# Altium schematic symbol library 13-Analog D 数模模数.SchLib: 573 symbols (part 3 of 6)
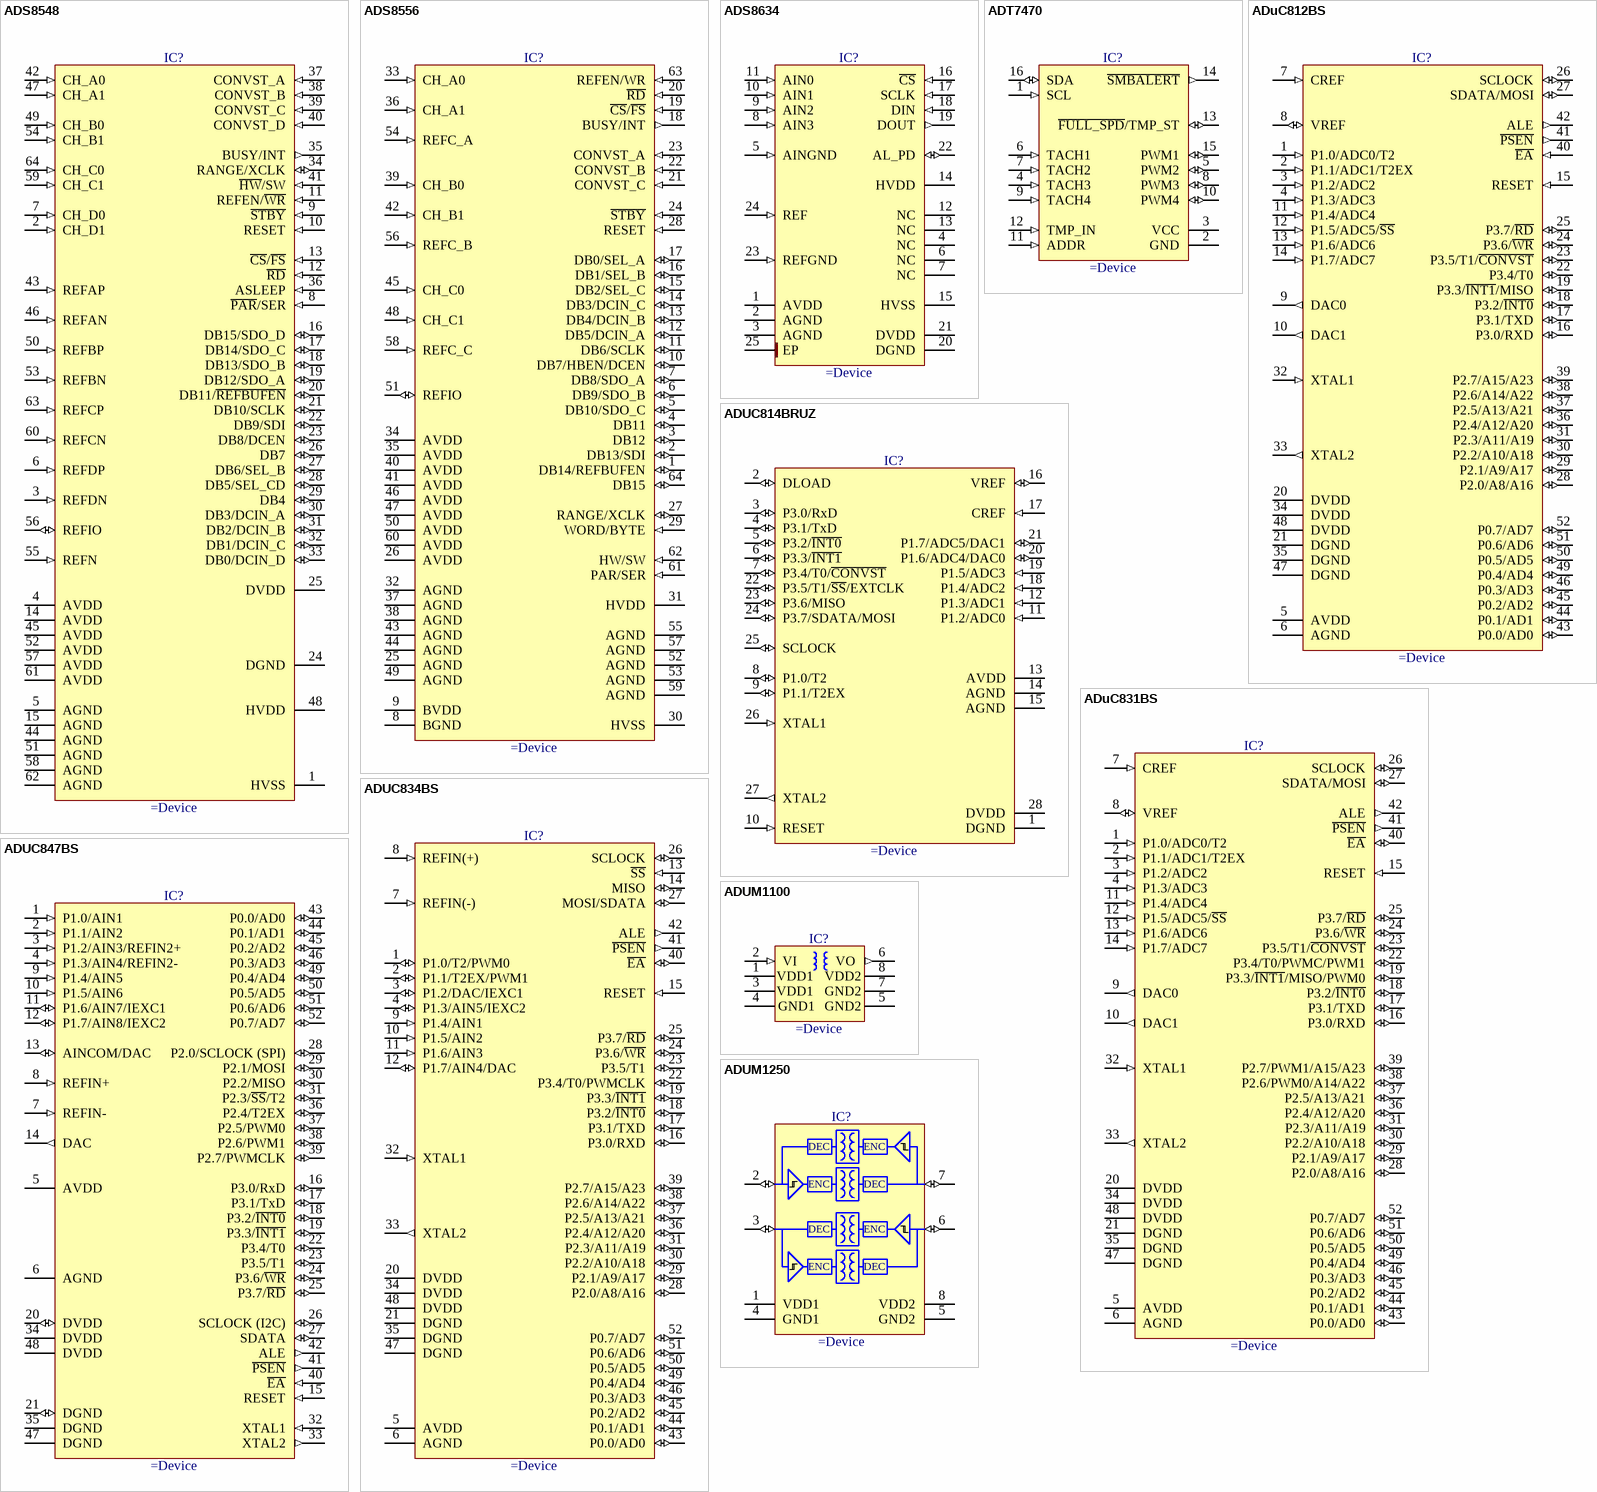
[diagram p42: symbols ADS8548 to ADUM1250]

## ADS8548
designator IC?
14-Bit, 600kSPS (PAR) or 450kSPS (SER), Eight-Channel, Simultaneous Sampling ADC
pins: 1 HVSS (power), 2 CH_D1 (in), 3 REFDN (in), 4 AVDD (power), 5 AGND (power), 6 REFDP (in), 7 CH_D0 (in), 8 ~{PAR}/SER (in), 9 ~{STBY} (in), 10 RESET (in), 11 REFEN/~{WR} (in), 12 ~{RD} (in), 13 ~{CS}/~{FS} (in), 14 AVDD (power), 15 AGND (power), 16 DB15/SDO_D (io), 17 DB14/SDO_C (io), 18 DB13/SDO_B (io), 19 DB12/SDO_A (io), 20 DB11/~{REFBUFEN} (io), 21 DB10/SCLK (io), 22 DB9/SDI (io), 23 DB8/DCEN (io), 24 DGND (power), 25 DVDD (power), 26 DB7 (io), 27 DB6/SEL_B (io), 28 DB5/SEL_CD (io), 29 DB4 (io), 30 DB3/DCIN_A (io), 31 DB2/DCIN_B (io), 32 DB1/DCIN_C (io), 33 DB0/DCIN_D (io), 34 RANGE/XCLK (io), 35 BUSY/INT (out), 36 ASLEEP (in), 37 CONVST_A (in), 38 CONVST_B (in), 39 CONVST_C (in), 40 CONVST_D (in), 41 ~{HW}/SW (in), 42 CH_A0 (in), 43 REFAP (in), 44 AGND (power), 45 AVDD (power), 46 REFAN (in), 47 CH_A1 (in), 48 HVDD (power), 49 CH_B0 (in), 50 REFBP (in), 51 AGND (power), 52 AVDD (power), 53 REFBN (in), 54 CH_B1 (in), 55 REFN (in), 56 REFIO (io), 57 AVDD (power), 58 AGND (power), 59 CH_C1 (in), 60 REFCN (in), 61 AVDD (power), 62 AGND (power), 63 REFCP (in), 64 CH_C0 (in)

## ADS8556
designator IC?
16-Bit, 630kSPS (PAR) or 450kSPS (SER), Six-Channel, Simultaneous Sampling ADC
pins: 1 DB14/REFBUFEN (io), 2 DB13/SDI (io), 3 DB12 (io), 4 DB11 (io), 5 DB10/SDO_C (io), 6 DB9/SDO_B (io), 7 DB8/SDO_A (io), 8 BGND (power), 9 BVDD (power), 10 DB7/HBEN/DCEN (io), 11 DB6/SCLK (io), 12 DB5/DCIN_A (io), 13 DB4/DCIN_B (io), 14 DB3/DCIN_C (io), 15 DB2/SEL_C (io), 16 DB1/SEL_B (io), 17 DB0/SEL_A (io), 18 BUSY/INT (out), 19 ~{CS}/~{FS} (in), 20 ~{RD} (in), 21 CONVST_C (in), 22 CONVST_B (in), 23 CONVST_A (in), 24 ~{STBY} (in), 25 AGND (power), 26 AVDD (power), 27 RANGE/XCLK (io), 28 RESET (in), 29 WORD/BYTE (in), 30 HVSS (power), 31 HVDD (power), 32 AGND (power), 33 CH_A0 (in), 34 AVDD (power), 35 AVDD (power), 36 CH_A1 (in), 37 AGND (power), 38 AGND (power), 39 CH_B0 (in), 40 AVDD (power), 41 AVDD (power), 42 CH_B1 (in), 43 AGND (power), 44 AGND (power), 45 CH_C0 (in), 46 AVDD (power), 47 AVDD (power), 48 CH_C1 (in), 49 AGND (power), 50 AVDD (power), 51 REFIO (io), 52 AGND (power), 53 AGND (power), 54 REFC_A (in), 55 AGND (power), 56 REFC_B (in), 57 AGND (power), 58 REFC_C (in), 59 AGND (power), 60 AVDD (power), 61 PAR/SER (in), 62 HW/SW (in), 63 REFEN/WR (in), 64 DB15 (io)

## ADS8634
designator IC?
12-Bit, 1MSPS, 4-Channel, Bipolar-Input, SAR Analog-to-Digital Converter with Software-Selectable Ranges
pins: 1 AVDD (power), 2 AGND (power), 3 AGND (power), 4 NC, 5 AINGND (in), 6 NC, 7 NC, 8 AIN3 (in), 9 AIN2 (in), 10 AIN1 (in), 11 AIN0 (in), 12 NC, 13 NC, 14 HVDD (power), 15 HVSS (power), 16 ~{CS} (in), 17 SCLK (in), 18 DIN (in), 19 DOUT (out), 20 DGND (power), 21 DVDD (power), 22 AL_PD (io), 23 REFGND (in), 24 REF (in), 25 EP (power)

## ADT7470
designator IC?
Temperature Sensor Hub and Fan Controller
pins: 1 SCL (in), 2 GND (power), 3 VCC (power), 4 TACH3 (in), 5 PWM2 (io), 6 TACH1 (in), 7 TACH2 (in), 8 PWM3 (io), 9 TACH4 (in), 10 PWM4 (io), 11 ADDR (in), 12 TMP_IN (in), 13 ~{FULL_SPD}/TMP_ST (io), 14 ~{SMBALERT} (out), 15 PWM1 (io), 16 SDA (io)

## ADuC812BS
designator IC?
MicroConverter®, Multichannel 12-Bit ADC With Embedded Flash MCU
pins: 1 P1.0/ADC0/T2 (in), 2 P1.1/ADC1/T2EX (in), 3 P1.2/ADC2 (in), 4 P1.3/ADC3 (in), 5 AVDD (power), 6 AGND (power), 7 CREF (in), 8 VREF (io), 9 DAC0 (out), 10 DAC1 (out), 11 P1.4/ADC4 (in), 12 P1.5/ADC5/~{SS} (in), 13 P1.6/ADC6 (in), 14 P1.7/ADC7 (in), 15 RESET (in), 16 P3.0/RXD (io), 17 P3.1/TXD (io), 18 P3.2/~{INT0} (io), 19 P3.3/~{INT1}/MISO (io), 20 DVDD (power), 21 DGND (power), 22 P3.4/T0 (io), 23 P3.5/T1/~{CONVST} (io), 24 P3.6/~{WR} (io), 25 P3.7/~{RD} (io), 26 SCLOCK (io), 27 SDATA/MOSI (io), 28 P2.0/A8/A16 (io), 29 P2.1/A9/A17 (io), 30 P2.2/A10/A18 (io), 31 P2.3/A11/A19 (io), 32 XTAL1 (in), 33 XTAL2 (out), 34 DVDD (power), 35 DGND (power), 36 P2.4/A12/A20 (io), 37 P2.5/A13/A21 (io), 38 P2.6/A14/A22 (io), 39 P2.7/A15/A23 (io), 40 ~{EA} (in), 41 ~{PSEN} (out), 42 ALE (out), 43 P0.0/AD0 (io), 44 P0.1/AD1 (io), 45 P0.2/AD2 (io), 46 P0.3/AD3 (io), 47 DGND (power), 48 DVDD (power), 49 P0.4/AD4 (io), 50 P0.5/AD5 (io), 51 P0.6/AD6 (io), 52 P0.7/AD7 (io)

## ADUC814BRUZ
designator IC?
MicroConverter®, Small Package 12-Bit ADC with Embedded Flash MCU
pins: 1 DGND (power), 2 DLOAD (io), 3 P3.0/RxD (io), 4 P3.1/TxD (io), 5 P3.2/~{INT0} (io), 6 P3.3/~{INT1} (io), 7 P3.4/T0/~{CONVST} (io), 8 P1.0/T2 (io), 9 P1.1/T2EX (io), 10 RESET (in), 11 P1.2/ADC0 (in), 12 P1.3/ADC1 (in), 13 AVDD (power), 14 AGND (power), 15 AGND (power), 16 VREF (io), 17 CREF (in), 18 P1.4/ADC2 (in), 19 P1.5/ADC3 (in), 20 P1.6/ADC4/DAC0 (io), 21 P1.7/ADC5/DAC1 (io), 22 P3.5/T1/~{SS}/EXTCLK (io), 23 P3.6/MISO (io), 24 P3.7/SDATA/MOSI (io), 25 SCLOCK (io), 26 XTAL1 (in), 27 XTAL2 (out), 28 DVDD (power)

## ADuC831BS
designator IC?
MicroConverter®, 12-Bit ADCs And DACs With Embedded 62 kBytes Flash MCU
pins: 1 P1.0/ADC0/T2 (in), 2 P1.1/ADC1/T2EX (in), 3 P1.2/ADC2 (in), 4 P1.3/ADC3 (in), 5 AVDD (power), 6 AGND (power), 7 CREF (in), 8 VREF (io), 9 DAC0 (out), 10 DAC1 (out), 11 P1.4/ADC4 (in), 12 P1.5/ADC5/~{SS} (in), 13 P1.6/ADC6 (in), 14 P1.7/ADC7 (in), 15 RESET (in), 16 P3.0/RXD (io), 17 P3.1/TXD (io), 18 P3.2/~{INT0} (io), 19 P3.3/~{INT1}/MISO/PWM0 (io), 20 DVDD (power), 21 DGND (power), 22 P3.4/T0/PWMC/PWM1 (io), 23 P3.5/T1/~{CONVST} (io), 24 P3.6/~{WR} (io), 25 P3.7/~{RD} (io), 26 SCLOCK (io), 27 SDATA/MOSI (io), 28 P2.0/A8/A16 (io), 29 P2.1/A9/A17 (io), 30 P2.2/A10/A18 (io), 31 P2.3/A11/A19 (io), 32 XTAL1 (in), 33 XTAL2 (out), 34 DVDD (power), 35 DGND (power), 36 P2.4/A12/A20 (io), 37 P2.5/A13/A21 (io), 38 P2.6/PWM0/A14/A22 (io), 39 P2.7/PWM1/A15/A23 (io), 40 ~{EA} (io), 41 ~{PSEN} (out), 42 ALE (out), 43 P0.0/AD0 (io), 44 P0.1/AD1 (io), 45 P0.2/AD2 (io), 46 P0.3/AD3 (io), 47 DGND (power), 48 DVDD (power), 49 P0.4/AD4 (io), 50 P0.5/AD5 (io), 51 P0.6/AD6 (io), 52 P0.7/AD7 (io)

## ADUC834BS
designator IC?
MicroConverter®, Dual 16-Bit/24-Bit Delta-Sigma ADC ADCs With Embedded 62 kB Flash MCU
pins: 1 P1.0/T2/PWM0 (io), 2 P1.1/T2EX/PWM1 (io), 3 P1.2/DAC/IEXC1 (io), 4 P1.3/AIN5/IEXC2 (io), 5 AVDD (power), 6 AGND (power), 7 REFIN(-) (in), 8 REFIN(+) (in), 9 P1.4/AIN1 (in), 10 P1.5/AIN2 (in), 11 P1.6/AIN3 (in), 12 P1.7/AIN4/DAC (io), 13 ~{SS} (in), 14 MISO (io), 15 RESET (in), 16 P3.0/RXD (io), 17 P3.1/TXD (io), 18 P3.2/~{INT0} (io), 19 P3.3/~{INT1} (io), 20 DVDD (power), 21 DGND (power), 22 P3.4/T0/PWMCLK (io), 23 P3.5/T1 (io), 24 P3.6/~{WR} (io), 25 P3.7/~{RD} (io), 26 SCLOCK (io), 27 MOSI/SDATA (io), 28 P2.0/A8/A16 (io), 29 P2.1/A9/A17 (io), 30 P2.2/A10/A18 (io), 31 P2.3/A11/A19 (io), 32 XTAL1 (in), 33 XTAL2 (out), 34 DVDD (power), 35 DGND (power), 36 P2.4/A12/A20 (io), 37 P2.5/A13/A21 (io), 38 P2.6/A14/A22 (io), 39 P2.7/A15/A23 (io), 40 ~{EA} (io), 41 ~{PSEN} (out), 42 ALE (out), 43 P0.0/AD0 (io), 44 P0.1/AD1 (io), 45 P0.2/AD2 (io), 46 P0.3/AD3 (io), 47 DGND (power), 48 DVDD (power), 49 P0.4/AD4 (io), 50 P0.5/AD5 (io), 51 P0.6/AD6 (io), 52 P0.7/AD7 (io)

## ADUC847BS
designator IC?
MicroConverter® Multichannel 24-Bit ADCs with Embedded 62 kB Flash and Single-Cycle MCU
pins: 1 P1.0/AIN1 (in), 2 P1.1/AIN2 (in), 3 P1.2/AIN3/REFIN2+ (in), 4 P1.3/AIN4/REFIN2- (in), 5 AVDD (power), 6 AGND (power), 7 REFIN- (in), 8 REFIN+ (in), 9 P1.4/AIN5 (in), 10 P1.5/AIN6 (in), 11 P1.6/AIN7/IEXC1 (io), 12 P1.7/AIN8/IEXC2 (io), 13 AINCOM/DAC (io), 14 DAC (out), 15 RESET (in), 16 P3.0/RxD (io), 17 P3.1/TxD (io), 18 P3.2/~{INT0} (io), 19 P3.3/~{INT1} (io), 20 DVDD (io), 21 DGND (io), 22 P3.4/T0 (io), 23 P3.5/T1 (io), 24 P3.6/~{WR} (io), 25 P3.7/~{RD} (io), 26 SCLOCK (I2C) (io), 27 SDATA (io), 28 P2.0/SCLOCK (SPI) (io), 29 P2.1/MOSI (io), 30 P2.2/MISO (io), 31 P2.3/~{SS}/T2 (io), 32 XTAL1 (in), 33 XTAL2 (out), 34 DVDD (power), 35 DGND (power), 36 P2.4/T2EX (io), 37 P2.5/PWM0 (io), 38 P2.6/PWM1 (io), 39 P2.7/PWMCLK (io), 40 ~{EA} (in), 41 ~{PSEN} (out), 42 ALE (out), 43 P0.0/AD0 (io), 44 P0.1/AD1 (io), 45 P0.2/AD2 (io), 46 P0.3/AD3 (io), 47 DGND (power), 48 DVDD (power), 49 P0.4/AD4 (io), 50 P0.5/AD5 (io), 51 P0.6/AD6 (io), 52 P0.7/AD7 (io)

## ADUM1100
designator IC?
iCoupler® Digital Isolator
pins: 1 VDD1 (power), 2 VI (in), 3 VDD1 (power), 4 GND1 (power), 5 GND2 (power), 6 VO (out), 7 GND2 (power), 8 VDD2 (power)

## ADUM1250
designator IC?
Hot Swappable, Dual I2C Isolator
pins: 1 VDD1 (power), 2 SDA1 (io), 3 SCL1 (io), 4 GND1 (power), 5 GND2 (power), 6 SCL2 (io), 7 SDA2 (io), 8 VDD2 (power)
text: DEC; ENC

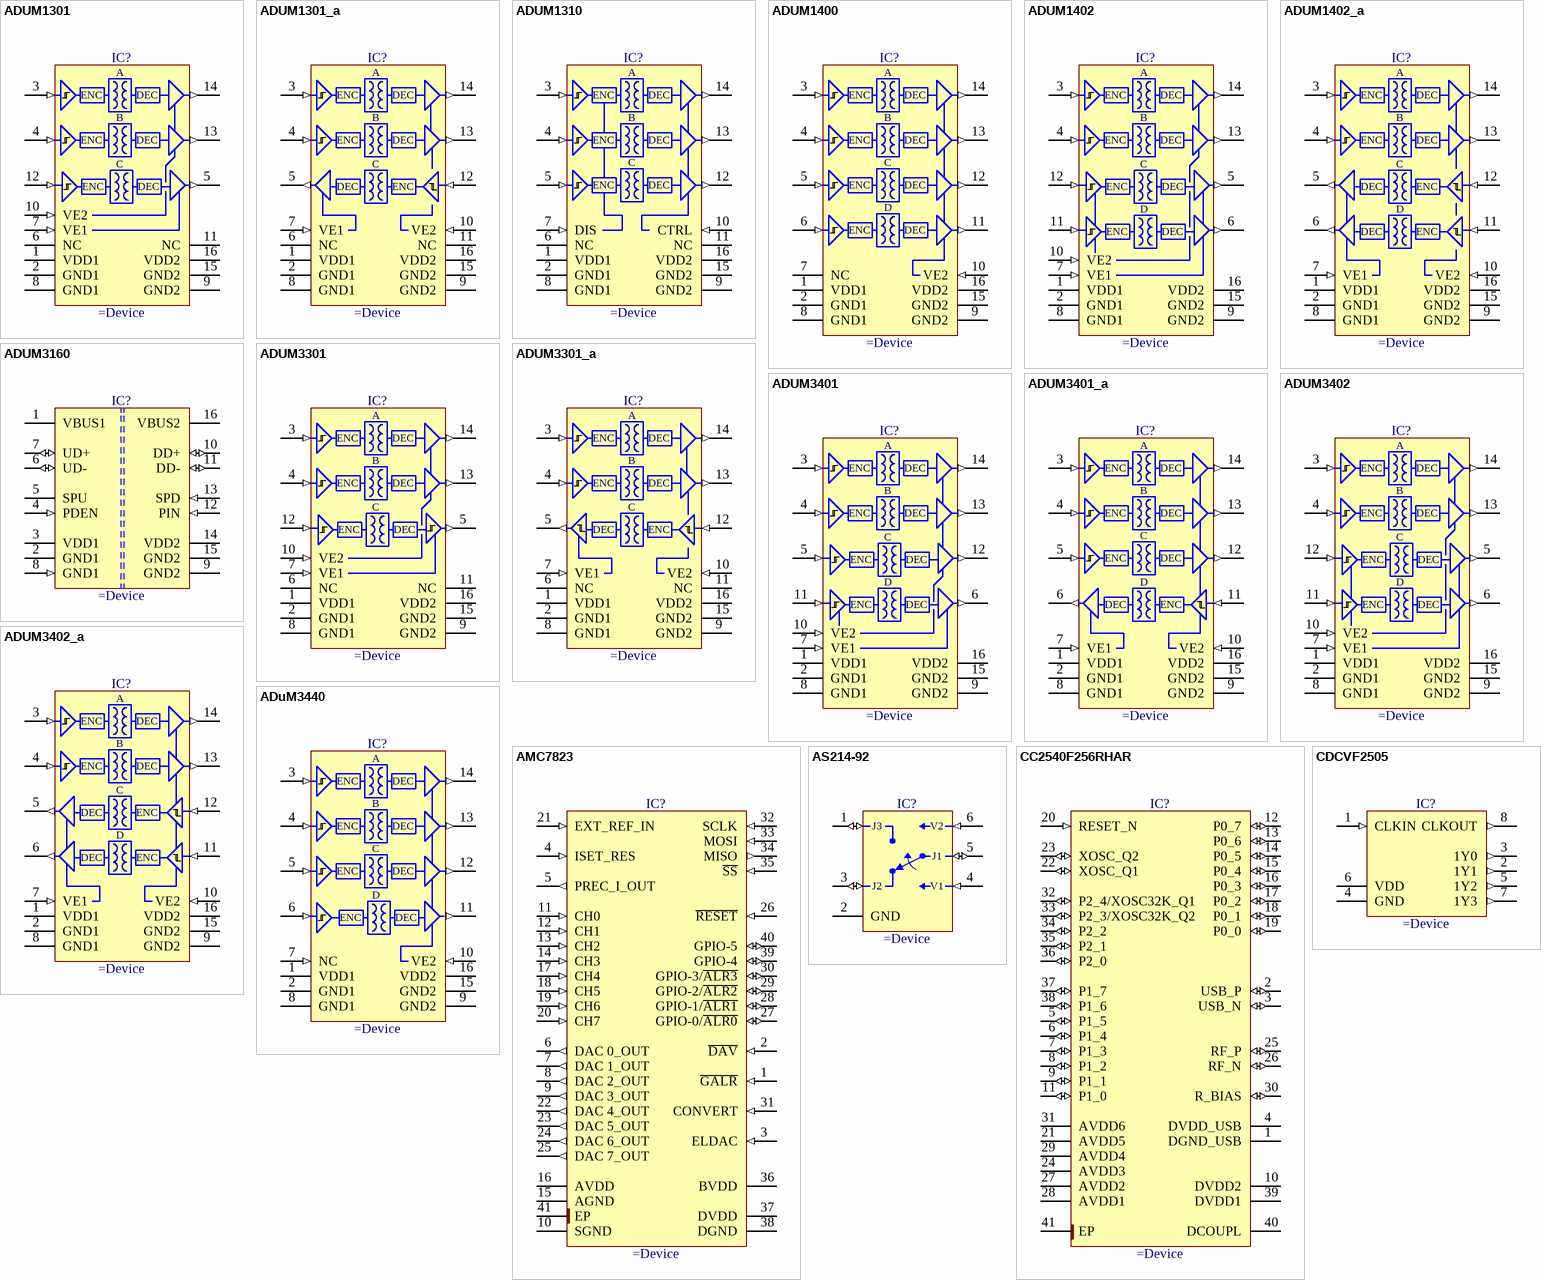
[diagram p15: symbols ADUM1301 to CDCVF2505]

## ADUM1301
designator IC?
Triple-Channel Digital Isolators
pins: 1 VDD1 (power), 2 GND1 (power), 3 VIA (in), 4 VIB (in), 5 VOC (out), 6 NC, 7 VE1 (in), 8 GND1 (power), 9 GND2 (power), 10 VE2 (in), 11 NC, 12 VIC (in), 13 VOB (out), 14 VOA (out), 15 GND2 (power), 16 VDD2 (power)
text: A; ENC; DEC; B; C

## ADUM1301_a
designator IC?
Triple-Channel Digital Isolators
pins: 1 VDD1 (power), 2 GND1 (power), 3 VIA (in), 4 VIB (in), 5 VOC (out), 6 NC, 7 VE1 (in), 8 GND1 (power), 9 GND2 (power), 10 VE2 (in), 11 NC, 12 VIC (in), 13 VOB (out), 14 VOA (out), 15 GND2 (power), 16 VDD2 (power)
text: A; ENC; DEC; B; C

## ADUM1310
designator IC?
Triple-Channel Digital Isolator
pins: 1 VDD1 (power), 2 GND1 (power), 3 VIA (in), 4 VIB (in), 5 VIC (in), 6 NC, 7 DIS (in), 8 GND1 (power), 9 GND2 (power), 10 CTRL (in), 11 NC, 12 VOC (out), 13 VOB (out), 14 VOA (out), 15 GND2 (power), 16 VDD2 (power)
text: A; ENC; DEC; B; C

## ADUM1400
designator IC?
Quad-Channel Digital Isolator
pins: 1 VDD1 (power), 2 GND1 (power), 3 VIA (in), 4 VIB (in), 5 VIC (in), 6 VID (in), 7 NC, 8 GND1 (power), 9 GND2 (power), 10 VE2 (in), 11 VOD (out), 12 VOC (out), 13 VOB (out), 14 VOA (out), 15 GND2 (power), 16 VDD2 (power)
text: A; ENC; DEC; B; C; D

## ADUM1402
designator IC?
Quad-Channel Digital Isolator (2/2 Channel Directionality)
pins: 1 VDD1 (power), 2 GND1 (power), 3 VIA (in), 4 VIB (in), 5 VOC (out), 6 VOD (out), 7 VE1 (in), 8 GND1 (power), 9 GND2 (power), 10 VE2 (in), 11 VID (in), 12 VIC (in), 13 VOB (out), 14 VOA (out), 15 GND2 (power), 16 VDD2 (power)
text: A; ENC; DEC; B; C; D

## ADUM1402_a
designator IC?
Quad-Channel Digital Isolator (2/2 Channel Directionality)
pins: 1 VDD1 (power), 2 GND1 (power), 3 VIA (in), 4 VIB (in), 5 VOC (out), 6 VOD (out), 7 VE1 (in), 8 GND1 (power), 9 GND2 (power), 10 VE2 (in), 11 VID (in), 12 VIC (in), 13 VOB (out), 14 VOA (out), 15 GND2 (power), 16 VDD2 (power)
text: A; ENC; DEC; B; C; D

## ADUM3160
designator IC?
Full/Low Speed 2.5 kV USB Digital Isolator
pins: 1 VBUS1 (power), 2 GND1 (power), 3 VDD1 (power), 4 PDEN (in), 5 SPU (power), 6 UD- (io), 7 UD+ (io), 8 GND1 (in), 9 GND2 (power), 10 DD+ (io), 11 DD- (io), 12 PIN (in), 13 SPD (in), 14 VDD2 (power), 15 GND2 (power), 16 VBUS2 (power)

## ADUM3301
designator IC?
Triple-Channel Digital Isolators
pins: 1 VDD1 (power), 2 GND1 (power), 3 VIA (in), 4 VIB (in), 5 VOC (out), 6 NC, 7 VE1 (in), 8 GND1 (power), 9 GND2 (power), 10 VE2 (in), 11 NC, 12 VIC (in), 13 VOB (out), 14 VOA (out), 15 GND2 (power), 16 VDD2 (power)
text: A; ENC; DEC; B; C

## ADUM3301_a
designator IC?
Triple-Channel Digital Isolators
pins: 1 VDD1 (power), 2 GND1 (power), 3 VIA (in), 4 VIB (in), 5 VOC (out), 6 NC, 7 VE1 (in), 8 GND1 (power), 9 GND2 (power), 10 VE2 (in), 11 NC, 12 VIC (in), 13 VOB (out), 14 VOA (out), 15 GND2 (power), 16 VDD2 (power)
text: A; ENC; DEC; B; C

## ADUM3401
designator IC?
Quad-Channel Digital Isolator, Enhanced System-Level ESD Reliability
pins: 1 VDD1 (power), 2 GND1 (power), 3 VIA (in), 4 VIB (in), 5 VIC (in), 6 VOD (out), 7 VE1 (in), 8 GND1 (power), 9 GND2 (power), 10 VE2 (in), 11 VID (in), 12 VOC (out), 13 VOB (out), 14 VOA (out), 15 GND2 (power), 16 VDD2 (power)
text: A; ENC; DEC; B; C; D

## ADUM3401_a
designator IC?
Quad-Channel, Digital Isolators, Enhanced System-Level ESD Reliability
pins: 1 VDD1 (power), 2 GND1 (power), 3 VIA (in), 4 VIB (in), 5 VIC (in), 6 VOD (out), 7 VE1 (in), 8 GND1 (power), 9 GND2 (power), 10 VE2 (in), 11 VID (in), 12 VOC (out), 13 VOB (out), 14 VOA (out), 15 GND2 (power), 16 VDD2 (power)
text: A; ENC; DEC; B; C; D

## ADUM3402
designator IC?
Quad-Channel Digital Isolator, Enhanced System-Level ESD Reliability
pins: 1 VDD1 (power), 2 GND1 (power), 3 VIA (in), 4 VIB (in), 5 VOC (out), 6 VOD (out), 7 VE1 (in), 8 GND1 (power), 9 GND2 (power), 10 VE2 (in), 11 VID (in), 12 VIC (in), 13 VOB (out), 14 VOA (out), 15 GND2 (power), 16 VDD2 (power)
text: A; ENC; DEC; B; C; D

## ADUM3402_a
designator IC?
Quad-Channel, Digital Isolators, Enhanced System-Level ESD Reliability
pins: 1 VDD1 (power), 2 GND1 (power), 3 VIA (in), 4 VIB (in), 5 VOC (out), 6 VOD (out), 7 VE1 (in), 8 GND1 (power), 9 GND2 (power), 10 VE2 (in), 11 VID (in), 12 VIC (in), 13 VOB (out), 14 VOA (out), 15 GND2 (power), 16 VDD2 (power)
text: A; ENC; DEC; B; C; D

## ADuM3440
designator IC?
Quad-Channel, High Speed Digital Isolator
pins: 1 VDD1 (power), 2 GND1 (power), 3 VIA (in), 4 VIB (in), 5 VIC (in), 6 VID (in), 7 NC (in), 8 GND1 (power), 9 GND2 (power), 10 VE2 (in), 11 VOD (out), 12 VOC (out), 13 VOB (out), 14 VOA (out), 15 GND2 (power), 16 VDD2 (power)
text: A; ENC; DEC; B; C; D

## AMC7823
designator IC?
Integrated, Multichannel ADC and DAC for Analog Monitoring & Control
pins: 1 ~{GALR} (in), 2 ~{DAV} (in), 3 ELDAC (in), 4 ISET_RES (in), 5 PREC_I_OUT (out), 6 DAC 0_OUT (out), 7 DAC 1_OUT (out), 8 DAC 2_OUT (out), 9 DAC 3_OUT (out), 10 SGND (power), 11 CH0 (in), 12 CH1 (in), 13 CH2 (in), 14 CH3 (in), 15 AGND (power), 16 AVDD (power), 17 CH4 (in), 18 CH5 (in), 19 CH6 (in), 20 CH7 (in), 21 EXT_REF_IN (in), 22 DAC 4_OUT (out), 23 DAC 5_OUT (out), 24 DAC 6_OUT (out), 25 DAC 7_OUT (out), 26 ~{RESET} (in), 27 GPIO-0/~{ALR0} (io), 28 GPIO-1/~{ALR1} (io), 29 GPIO-2/~{ALR2} (io), 30 GPIO-3/~{ALR3} (io), 31 CONVERT (in), 32 SCLK (in), 33 MOSI (in), 34 MISO (out), 35 ~{SS} (in), 36 BVDD (power), 37 DVDD (power), 38 DGND (power), 39 GPIO-4 (io), 40 GPIO-5 (io), 41 EP (power)

## AS214-92
designator IC?
PHEMT GaAs IC SPDT Switch 0.1-3 GHz
pins: 1 J3 (io), 2 GND (power), 3 J2 (io), 4 V1 (in), 5 J1 (io), 6 V2 (in)

## CC2540F256RHAR
designator IC?
2.4GHz Bluetooth Low Energy System-on-Chip Solution With 256 KB of Flash Memory
pins: 1 DGND_USB (power), 2 USB_P (io), 3 USB_N (io), 4 DVDD_USB (power), 5 P1_5 (io), 6 P1_4 (io), 7 P1_3 (io), 8 P1_2 (io), 9 P1_1 (io), 10 DVDD2 (power), 11 P1_0 (io), 12 P0_7 (io), 13 P0_6 (io), 14 P0_5 (io), 15 P0_4 (io), 16 P0_3 (io), 17 P0_2 (io), 18 P0_1 (io), 19 P0_0 (io), 20 RESET_N (in), 21 AVDD5 (power), 22 XOSC_Q1 (io), 23 XOSC_Q2 (io), 24 AVDD3 (power), 25 RF_P (io), 26 RF_N (io), 27 AVDD2 (power), 28 AVDD1 (power), 29 AVDD4 (power), 30 R_BIAS (io), 31 AVDD6 (power), 32 P2_4/XOSC32K_Q1 (io), 33 P2_3/XOSC32K_Q2 (io), 34 P2_2 (io), 35 P2_1 (io), 36 P2_0 (io), 37 P1_7 (io), 38 P1_6 (io), 39 DVDD1 (power), 40 DCOUPL (power), 41 EP (power)

## CDCVF2505
designator IC?
3.3V Clock Phase-Lock Loop Clock Driver
pins: 1 CLKIN (in), 2 1Y1 (out), 3 1Y0 (out), 4 GND (power), 5 1Y2 (out), 6 VDD (power), 7 1Y3 (out), 8 CLKOUT (out)

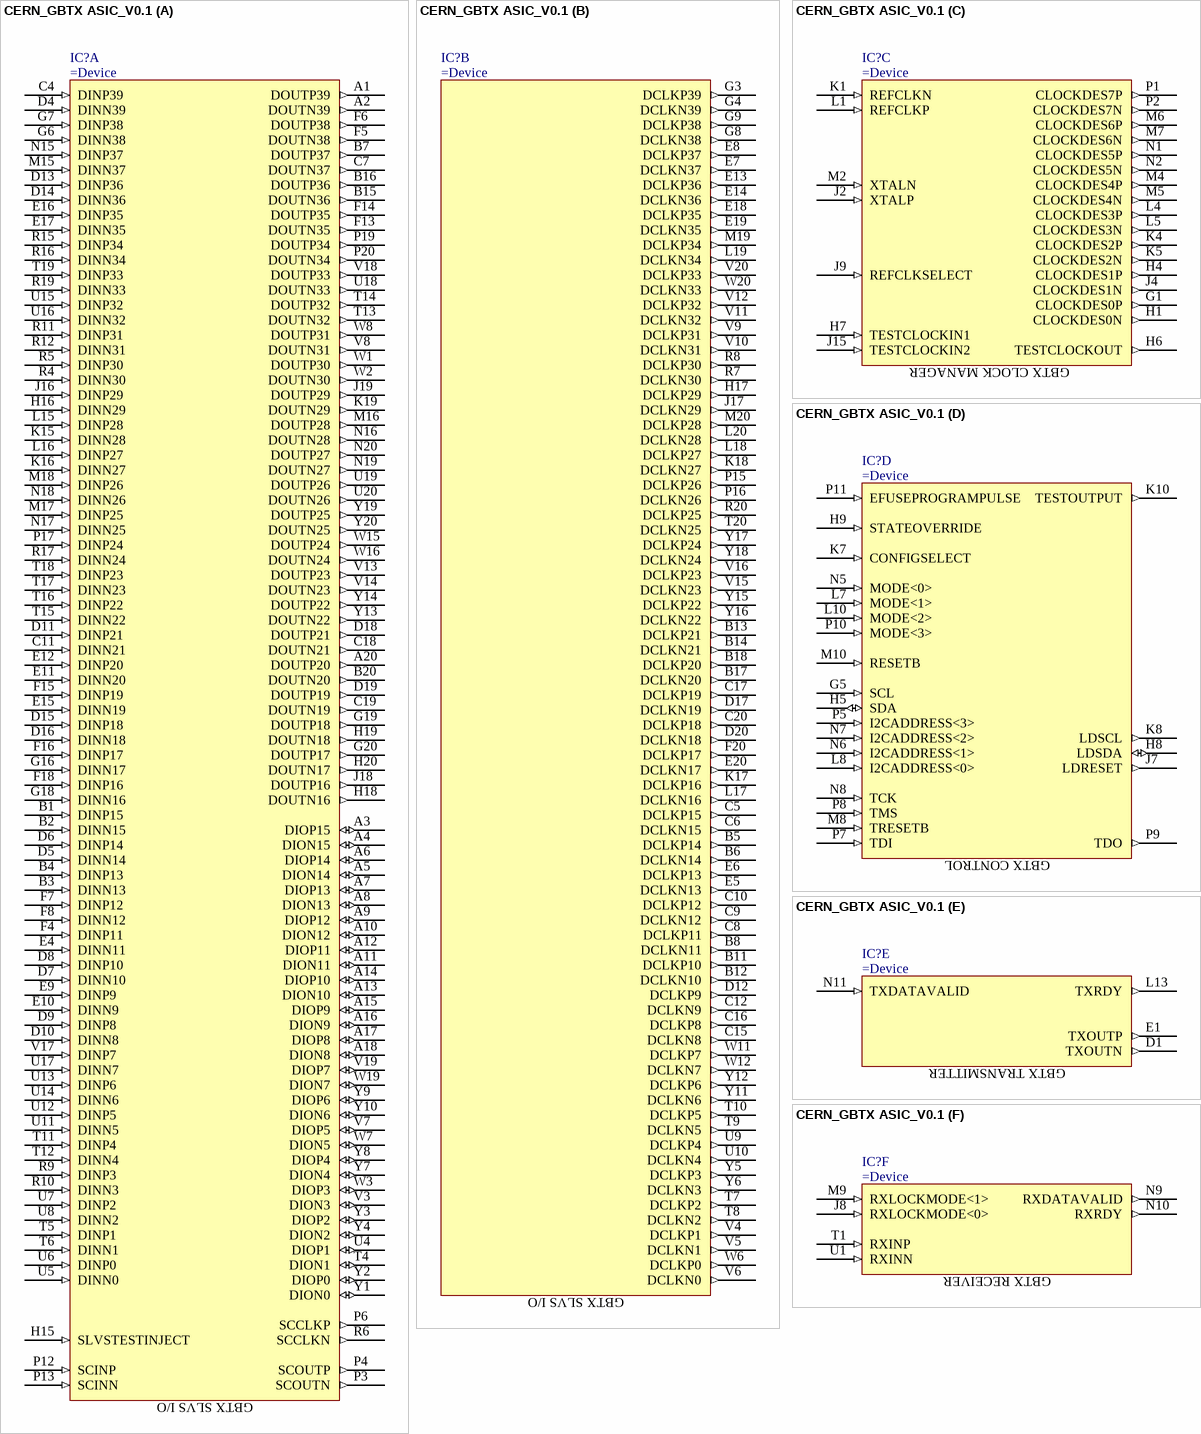
[diagram p16: symbol CERN_GBTX ASIC_V0.1]

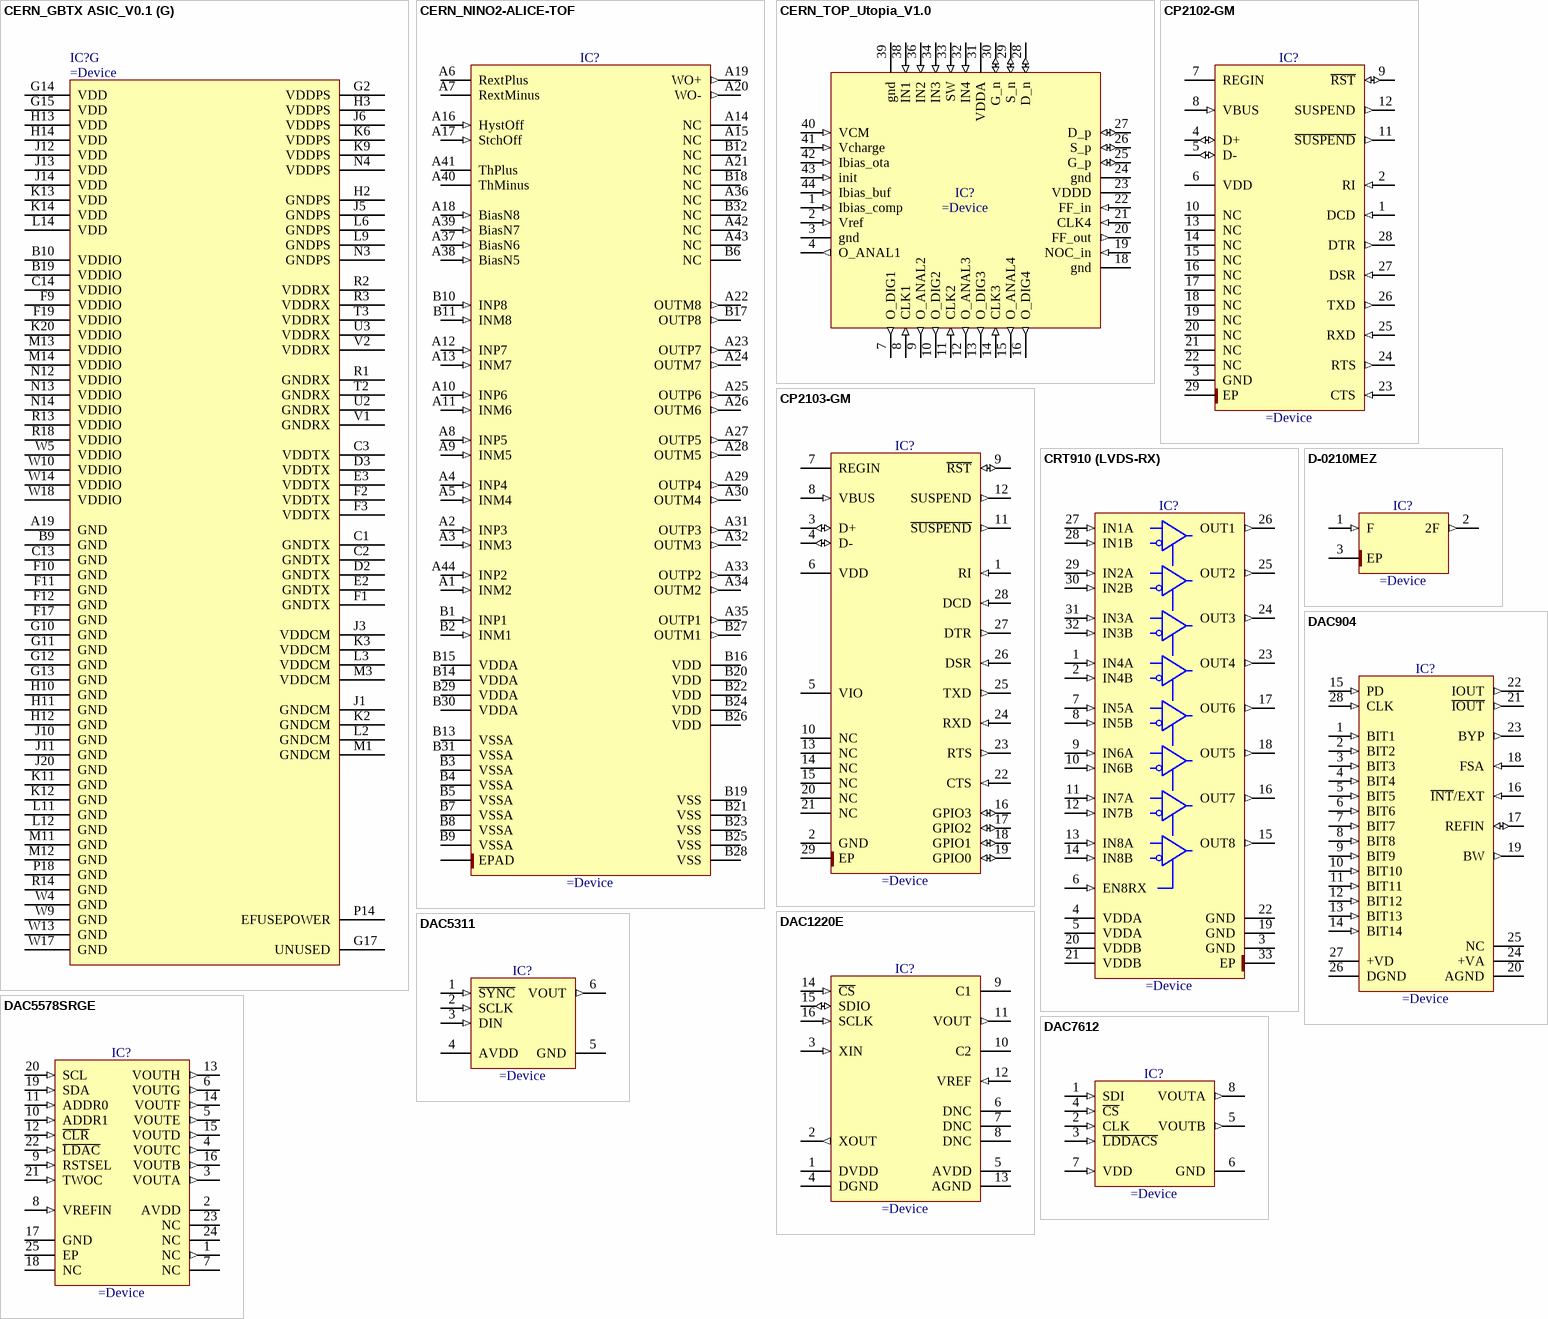
[diagram p17: symbols CERN_GBTX ASIC_V0.1 to DAC7612]

## CERN_GBTX ASIC_V0.1
designator IC?
GigaBit Transceiver ASIC (GBTX)
part A pins: A1 DOUTP39 (out), A2 DOUTN39 (out), A3 DIOP15 (io), A4 DION15 (io), A5 DION14 (io), A6 DIOP14 (io), A7 DIOP13 (io), A8 DION13 (io), A9 DIOP12 (io), A10 DION12 (io), A11 DION11 (io), A12 DIOP11 (io), A13 DION10 (io), A14 DIOP10 (io), A15 DIOP9 (io), A16 DION9 (io), A17 DIOP8 (io), A18 DION8 (io), A20 DOUTP20 (out), B1 DINP15 (in), B2 DINN15 (in), B3 DINN13 (in), B4 DINP13 (in), B7 DOUTP37 (out), B15 DOUTN36 (out), B16 DOUTP36 (out), B20 DOUTN20 (out), C4 DINP39 (in), C7 DOUTN37 (out), C11 DINN21 (in), C18 DOUTN21 (out), C19 DOUTN19 (out), D4 DINN39 (in), D5 DINN14 (in), D6 DINP14 (in), D7 DINN10 (in), D8 DINP10 (in), D9 DINP8 (in), D10 DINN8 (in), D11 DINP21 (in), D13 DINP36 (in), D14 DINN36 (in), D15 DINP18 (in), D16 DINN18 (in), D18 DOUTP21 (out), D19 DOUTP19 (out), E4 DINN11 (in), E9 DINP9 (in), E10 DINN9 (in), E11 DINN20 (in), E12 DINP20 (in), E15 DINN19 (in), E16 DINP35 (in), E17 DINN35 (in), F4 DINP11 (in), F5 DOUTN38 (out), F6 DOUTP38 (out), F7 DINP12 (in), F8 DINN12 (in), F13 DOUTN35 (out), F14 DOUTP35 (out), F15 DINP19 (in), F16 DINP17 (in), F18 DINP16 (in), G6 DINN38 (in), G7 DINP38 (in), G16 DINN17 (in), G18 DINN16 (in), G19 DOUTP18 (out), G20 DOUTP17 (out), H15 SLVSTESTINJECT (in), H16 DINN29 (in), H18 DOUTN16 (out), H19 DOUTN18 (out), H20 DOUTN17 (out), J16 DINP29 (in), J18 DOUTP16 (out), J19 DOUTP29 (out), K15 DINN28 (in), K16 DINN27 (in), K19 DOUTN29 (out), L15 DINP28 (in), L16 DINP27 (in), M15 DINN37 (in), M16 DOUTP28 (out), M17 DINP25 (in), M18 DINP26 (in), N15 DINP37 (in), N16 DOUTN28 (out), N17 DINN25 (in), N18 DINN26 (in), N19 DOUTN27 (out), N20 DOUTP27 (out), P3 SCOUTN (out), P4 SCOUTP (out), P6 SCCLKP (out), P12 SCINP (in), P13 SCINN (in), P17 DINP24 (in), P19 DOUTP34 (out), P20 DOUTN34 (out), R4 DINN30 (in), R5 DINP30 (in), R6 SCCLKN (out), R9 DINP3 (in), R10 DINN3 (in), R11 DINP31 (in), R12 DINN31 (in), R15 DINP34 (in), R16 DINN34 (in), R17 DINN24 (in), R19 DINN33 (in), T4 DION1 (io), T5 DINP1 (in), T6 DINN1 (in), T11 DINP4 (in), T12 DINN4 (in), T13 DOUTN32 (out), T14 DOUTP32 (out), T15 DINN22 (in), T16 DINP22 (in), T17 DINN23 (in), T18 DINP23 (in), T19 DINP33 (in), U4 DIOP1 (io), U5 DINN0 (in), U6 DINP0 (in), U7 DINP2 (in), U8 DINN2 (in), U11 DINN5 (in), U12 DINP5 (in), U13 DINP6 (in), U14 DINN6 (in), U15 DINP32 (in), U16 DINN32 (in), U17 DINN7 (in), U18 DOUTN33 (out), U19 DOUTP26 (out), U20 DOUTN26 (out), V3 DION3 (io), V7 DIOP5 (io), V8 DOUTN31 (out), V13 DOUTP23 (out), V14 DOUTN23 (out), V17 DINP7 (in), V18 DOUTP33 (out), V19 DIOP7 (io), W1 DOUTP30 (out), W2 DOUTN30 (out), W3 DIOP3 (io), W7 DION5 (io), W8 DOUTP31 (out), W15 DOUTP24 (out), W16 DOUTN24 (out), W19 DION7 (io), Y1 DION0 (io), Y2 DIOP0 (io), Y3 DIOP2 (io), Y4 DION2 (io), Y7 DION4 (io), Y8 DIOP4 (io), Y9 DIOP6 (io), Y10 DION6 (io), Y13 DOUTN22 (out), Y14 DOUTP22 (out), Y19 DOUTP25 (out), Y20 DOUTN25 (out)
part B pins: B5 DCLKP14 (out), B6 DCLKN14 (out), B8 DCLKN11 (out), B11 DCLKP10 (out), B12 DCLKN10 (out), B13 DCLKP21 (out), B14 DCLKN21 (out), B17 DCLKN20 (out), B18 DCLKP20 (out), C5 DCLKP15 (out), C6 DCLKN15 (out), C8 DCLKP11 (out), C9 DCLKN12 (out), C10 DCLKP12 (out), C12 DCLKN9 (out), C15 DCLKN8 (out), C16 DCLKP8 (out), C17 DCLKP19 (out), C20 DCLKP18 (out), D12 DCLKP9 (out), D17 DCLKN19 (out), D20 DCLKN18 (out), E5 DCLKN13 (out), E6 DCLKP13 (out), E7 DCLKN37 (out), E8 DCLKP37 (out), E13 DCLKP36 (out), E14 DCLKN36 (out), E18 DCLKP35 (out), E19 DCLKN35 (out), E20 DCLKN17 (out), F20 DCLKP17 (out), G3 DCLKP39 (out), G4 DCLKN39 (out), G8 DCLKN38 (out), G9 DCLKP38 (out), H17 DCLKP29 (out), J17 DCLKN29 (out), K17 DCLKP16 (out), K18 DCLKN27 (out), L17 DCLKN16 (out), L18 DCLKP27 (out), L19 DCLKN34 (out), L20 DCLKN28 (out), M19 DCLKP34 (out), M20 DCLKP28 (out), P15 DCLKP26 (out), P16 DCLKN26 (out), R7 DCLKN30 (out), R8 DCLKP30 (out), R20 DCLKP25 (out), T7 DCLKP2 (out), T8 DCLKN2 (out), T9 DCLKN5 (out), T10 DCLKP5 (out), T20 DCLKN25 (out), U9 DCLKP4 (out), U10 DCLKN4 (out), V4 DCLKP1 (out), V5 DCLKN1 (out), V6 DCLKN0 (out), V9 DCLKP31 (out), V10 DCLKN31 (out), V11 DCLKN32 (out), V12 DCLKP32 (out), V15 DCLKN23 (out), V16 DCLKP23 (out), V20 DCLKP33 (out), W6 DCLKP0 (out), W11 DCLKP7 (out), W12 DCLKN7 (out), W20 DCLKN33 (out), Y5 DCLKP3 (out), Y6 DCLKN3 (out), Y11 DCLKN6 (out), Y12 DCLKP6 (out), Y15 DCLKP22 (out), Y16 DCLKN22 (out), Y17 DCLKP24 (out), Y18 DCLKN24 (out)
part C pins: G1 CLOCKDES0P (out), H1 CLOCKDES0N (out), H4 CLOCKDES1P (out), H6 TESTCLOCKOUT (out), H7 TESTCLOCKIN1 (in), J2 XTALP (in), J4 CLOCKDES1N (out), J9 REFCLKSELECT (in), J15 TESTCLOCKIN2 (in), K1 REFCLKN (in), K4 CLOCKDES2P (out), K5 CLOCKDES2N (out), L1 REFCLKP (in), L4 CLOCKDES3P (out), L5 CLOCKDES3N (out), M2 XTALN (in), M4 CLOCKDES4P (out), M5 CLOCKDES4N (out), M6 CLOCKDES6P (out), M7 CLOCKDES6N (out), N1 CLOCKDES5P (out), N2 CLOCKDES5N (out), P1 CLOCKDES7P (out), P2 CLOCKDES7N (out)
part D pins: G5 SCL (in), H5 SDA (io), H8 LDSDA (io), H9 STATEOVERRIDE (in), J7 LDRESET (out), K7 CONFIGSELECT (in), K8 LDSCL (out), K10 TESTOUTPUT (out), L7 MODE<1> (in), L8 I2CADDRESS<0> (in), L10 MODE<2> (in), M8 TRESETB (in), M10 RESETB (in), N5 MODE<0> (in), N6 I2CADDRESS<1> (in), N7 I2CADDRESS<2> (in), N8 TCK (in), P5 I2CADDRESS<3> (in), P7 TDI (in), P8 TMS (in), P9 TDO (out), P10 MODE<3> (in), P11 EFUSEPROGRAMPULSE (in)
part E pins: D1 TXOUTN (out), E1 TXOUTP (out), L13 TXRDY (out), N11 TXDATAVALID (in)
part F pins: J8 RXLOCKMODE<0> (in), M9 RXLOCKMODE<1> (in), N9 RXDATAVALID (out), N10 RXRDY (out), T1 RXINP (in), U1 RXINN (in)
part G pins: A19 GND (power), B9 GND (power), B10 VDDIO (power), B19 VDDIO (power), C1 GNDTX (power), C2 GNDTX (power), C3 VDDTX (power), C13 GND (power), C14 VDDIO (power), D2 GNDTX (power), D3 VDDTX (power), E2 GNDTX (power), E3 VDDTX (power), F1 GNDTX (power), F2 VDDTX (power), F3 VDDTX (power), F9 VDDIO (power), F10 GND (power), F11 GND (power), F12 GND (power), F17 GND (power), F19 VDDIO (power), G2 VDDPS (power), G10 GND (power), G11 GND (power), G12 GND (power), G13 GND (power), G14 VDD (power), G15 VDD (power), G17 UNUSED, H2 GNDPS (power), H3 VDDPS (power), H10 GND (power), H11 GND (power), H12 GND (power), H13 VDD (power), H14 VDD (power), J1 GNDCM (power), J3 VDDCM (power), J5 GNDPS (power), J6 VDDPS (power), J10 GND (power), J11 GND (power), J12 VDD (power), J13 VDD (power), J14 VDD (power), J20 GND (power), K2 GNDCM (power), K3 VDDCM (power), K6 VDDPS (power), K9 VDDPS (power), K11 GND (power), K12 GND (power), K13 VDD (power), K14 VDD (power), K20 VDDIO (power), L2 GNDCM (power), L3 VDDCM (power), L6 GNDPS (power), L9 GNDPS (power), L11 GND (power), L12 GND (power), L14 VDD (power), M1 GNDCM (power), M3 VDDCM (power), M11 GND (power), M12 GND (power), M13 VDDIO (power), M14 VDDIO (power), N3 GNDPS (power), N4 VDDPS (power), N12 VDDIO (power), N13 VDDIO (power), N14 VDDIO (power), P14 EFUSEPOWER (power), P18 GND (power), R1 GNDRX (power), R2 VDDRX (power), R3 VDDRX (power), R13 VDDIO (power), R14 GND (power), R18 VDDIO (power), T2 GNDRX (power), T3 VDDRX (power), U2 GNDRX (power), U3 VDDRX (power), V1 GNDRX (power), V2 VDDRX (power), W4 GND (power), W5 VDDIO (power), W9 GND (power), W10 VDDIO (power), W13 GND (power), W14 VDDIO (power), W17 GND (power), W18 VDDIO (power)
part A text: GBTX SLVS I/O
part B text: GBTX SLVS I/O
part C text: GBTX CLOCK MANAGER
part D text: GBTX CONTROL
part E text: GBTX TRANSMITTER
part F text: GBTX RECEIVER

## CERN_NINO2-ALICE-TOF
designator IC?
Fast front-end preamplifier-discriminator chip developed by ALICE
pins: A1 INM2 (in), A2 INP3 (in), A3 INM3 (in), A4 INP4 (in), A5 INM4 (in), A6 RextPlus, A7 RextMinus, A8 INP5 (in), A9 INM5 (in), A10 INP6 (in), A11 INM6 (in), A12 INP7 (in), A13 INM7 (in), A14 NC, A15 NC, A16 HystOff (in), A17 StchOff (in), A18 BiasN8 (in), A19 WO+ (out), A20 WO- (out), A21 NC, A22 OUTM8 (out), A23 OUTP7 (out), A24 OUTM7 (out), A25 OUTP6 (out), A26 OUTM6 (out), A27 OUTP5 (out), A28 OUTM5 (out), A29 OUTP4 (out), A30 OUTM4 (out), A31 OUTP3 (out), A32 OUTM3 (out), A33 OUTP2 (out), A34 OUTM2 (out), A35 OUTP1 (out), A36 NC, A37 BiasN6 (in), A38 BiasN5 (in), A39 BiasN7 (in), A40 ThMinus, A41 ThPlus, A42 NC, A43 NC, A44 INP2 (in), B1 INP1 (in), B2 INM1 (in), B3 VSSA (power), B4 VSSA (power), B5 VSSA (power), B6 NC, B7 VSSA (power), B8 VSSA (power), B9 VSSA (power), B10 INP8 (in), B11 INM8 (in), B12 NC, B13 VSSA (power), B14 VDDA (power), B15 VDDA (power), B16 VDD (power), B17 OUTP8 (out), B18 NC, B19 VSS (power), B20 VDD (power), B21 VSS (power), B22 VDD (power), B23 VSS (power), B24 VDD (power), B25 VSS (power), B26 VDD (power), B27 OUTM1 (out), B28 VSS (power), B29 VDDA (power), B30 VDDA (power), B31 VSSA (power), B32 NC, EP EPAD (power)

## CERN_TOP_Utopia_V1.0
designator IC?
Synchronous Charge to Frequency Converter (CFC) Architecture Tester (Asic developed at CERN)
pins: 1 Ibias_comp (in), 2 Vref (in), 3 gnd (power), 4 O_ANAL1 (out), 7 O_DIG1 (out), 8 CLK1 (in), 9 O_ANAL2 (out), 10 O_DIG2 (out), 11 CLK2 (in), 12 O_ANAL3 (out), 13 O_DIG3 (out), 14 CLK3 (in), 15 O_ANAL4 (out), 16 O_DIG4 (out), 18 gnd (power), 19 NOC_in (in), 20 FF_out (out), 21 CLK4 (in), 22 FF_in (in), 23 VDDD (power), 24 gnd (power), 25 G_p (io), 26 S_p (io), 27 D_p (io), 28 D_n (io), 29 S_n (io), 30 G_n (io), 31 VDDA (power), 32 IN4 (in), 33 SW (in), 34 IN3 (in), 36 IN2 (in), 38 IN1 (in), 39 gnd (power), 40 VCM (in), 41 Vcharge (in), 42 Ibias_ota (in), 43 init (in), 44 Ibias_buf (in)

## CP2102-GM
designator IC?
Single-Chip USB to UART Bridge
pins: 1 DCD (in), 2 RI (in), 3 GND (power), 4 D+ (io), 5 D- (io), 6 VDD (power), 7 REGIN (power), 8 VBUS (in), 9 ~{RST} (io), 10 NC, 11 ~{SUSPEND} (out), 12 SUSPEND (out), 13 NC, 14 NC, 15 NC, 16 NC, 17 NC, 18 NC, 19 NC, 20 NC, 21 NC, 22 NC, 23 CTS (in), 24 RTS (out), 25 RXD (in), 26 TXD (out), 27 DSR (in), 28 DTR (out), 29 EP (power)

## CP2103-GM
designator IC?
Single-Chip USB to UART Bridge
pins: 1 RI (in), 2 GND (power), 3 D+ (io), 4 D- (io), 5 VIO (power), 6 VDD (power), 7 REGIN (power), 8 VBUS (in), 9 ~{RST} (io), 10 NC, 11 ~{SUSPEND} (out), 12 SUSPEND (out), 13 NC, 14 NC, 15 NC, 16 GPIO3 (io), 17 GPIO2 (io), 18 GPIO1 (io), 19 GPIO0 (io), 20 NC, 21 NC, 22 CTS (in), 23 RTS (out), 24 RXD (in), 25 TXD (out), 26 DSR (in), 27 DTR (out), 28 DCD (in), 29 EP (power)

## CRT910 (LVDS-RX)
designator IC?
8 Channel Differential Line Receiver
pins: 1 IN4A (in), 2 IN4B (in), 3 GND (power), 4 VDDA (power), 5 VDDA (power), 6 EN8RX (in), 7 IN5A (in), 8 IN5B (in), 9 IN6A (in), 10 IN6B (in), 11 IN7A (in), 12 IN7B (in), 13 IN8A (in), 14 IN8B (in), 15 OUT8 (out), 16 OUT7 (out), 17 OUT6 (out), 18 OUT5 (out), 19 GND (power), 20 VDDB (power), 21 VDDB (power), 22 GND (power), 23 OUT4 (out), 24 OUT3 (out), 25 OUT2 (out), 26 OUT1 (out), 27 IN1A (in), 28 IN1B (in), 29 IN2A (in), 30 IN2B (in), 31 IN3A (in), 32 IN3B (in), 33 EP (power)

## D-0210MEZ
designator IC?
Frequency Doubler - Input 2.0 to 10.0 GHz, Output 4.0 to 20.0 GHz
pins: 1 F (in), 2 2F (out), 3 EP (power)

## DAC904
designator IC?
14-Bit, 165MSPS SpeedPlus(TM) DAC Scalable Current Outputs between 2mA to 20mA
pins: 1 BIT1 (in), 2 BIT2 (in), 3 BIT3 (in), 4 BIT4 (in), 5 BIT5 (in), 6 BIT6 (in), 7 BIT7 (in), 8 BIT8 (in), 9 BIT9 (in), 10 BIT10 (in), 11 BIT11 (in), 12 BIT12 (in), 13 BIT13 (in), 14 BIT14 (in), 15 PD (in), 16 ~{INT}/EXT (in), 17 REFIN (io), 18 FSA (in), 19 BW (out), 20 AGND (power), 21 ~{IOUT} (out), 22 IOUT (out), 23 BYP (out), 24 +VA (power), 25 NC, 26 DGND (power), 27 +VD (power), 28 CLK (in)